# Altium footprint library OpenBMS.PcbLib: 21 footprints (part 2 of 2)
Each footprint in its own frame and in the unit in brackets; x right, y up, seen from the top. Pads: shape width x height; smd on the part's side, far side on the other; paste and mask are expansions set on the pad; w line width, h text height; cw(c..) or ccw(c..) is an arc to the next point about the centre after c.
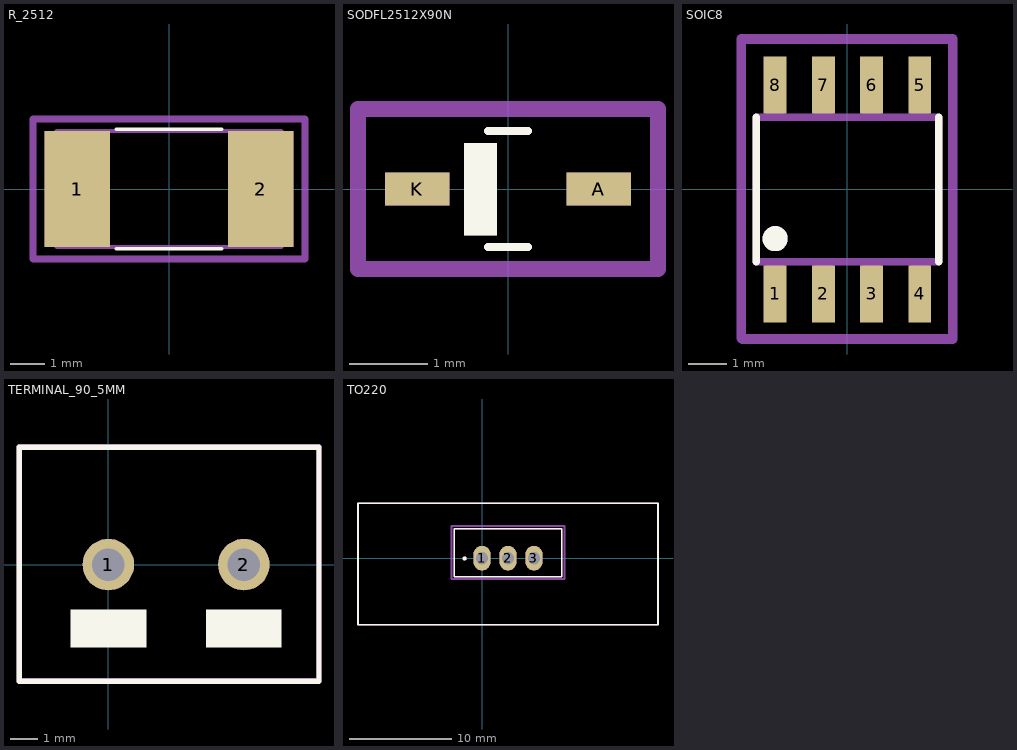
[diagram p1: the footprints below, top view; thin cyan lines are the x and y axes]

## R_2512 [mm]
pads (4):
  rect 1.9x3.37 smd: 1(-2.66,0) 2(2.66,0)
  rect 1.9x3.37 on Mech15: 1(-2.66,0) 2(2.66,0)
Top Overlay:
  lines w0.1: -1.524,-1.727 1.524,-1.727 ; -1.524,1.727 1.524,1.727
Mechanical 4:
  lines w0.127: -3.25,-1.68 3.25,-1.68 ; -3.25,-1.68 -3.25,1.68 ; -3.25,-1.68 3.25,-1.68 ; -3.25,-1.68 -3.25,1.68 ; -3.25,1.68 3.25,1.68 ; -3.25,1.68 3.25,1.68 ; 3.25,-1.68 3.25,1.68 ; 3.25,-1.68 3.25,1.68
Mechanical 15:
  lines w0.2: -3.937,-2.032 3.937,-2.032 3.937,2.032 -3.937,2.032 -3.937,-2.032
3D body "CRGP2512F39R.STEP": height 0.66, standoff 0.01, extent -3.2,-1.6 3.15,1.6

## SODFL2512X90N [mm]
pads (4):
  rect 0.82x0.42 smd: A(1.15,0) K(-1.15,0)
  rect 0.82x0.42 on Mech15: A(1.15,0) K(-1.15,0)
Top Overlay:
  region: -0.141,-0.584 -0.559,-0.584 -0.559,0.584 -0.141,0.584
  lines w0.1: -0.254,-0.737 0.254,-0.737 ; -0.254,0.737 0.254,0.737
Mechanical 15:
  region: -0.141,-0.584 -0.559,-0.584 -0.559,0.584 -0.141,0.584
  lines w0.1: -0.254,-0.737 0.254,-0.737 ; -0.254,0.737 0.254,0.737
  lines w0.2: -1.905,-1.016 -1.905,1.016 1.905,1.016 1.905,-1.016 -1.905,-1.016
3D body "User Library-SOD-323F.STEP": height 0.78, standoff -0.1, extent -1.368,-0.675 1.332,0.675

## SOIC8 [mm]
pads (8):
  rect 0.6x1.5 smd: 1(-1.905,-2.75) 2(-0.635,-2.75) 3(0.635,-2.75) 4(1.905,-2.75) 5(1.905,2.75) 6(0.635,2.75) 7(-0.635,2.75) 8(-1.905,2.75)
Top Overlay:
  circle w0.508: c-1.905,-1.295 r0.076
  lines w0.203: -2.4,-1.9 -2.4,-1.4 -2.4,1.9 ; 2.4,-1.9 2.4,-1.4 2.4,1.9
Mechanical 15:
  circle w0.508: c-1.905,-1.295 r0.076
  region: -0.39,-3.1 -0.88,-3.1 -0.88,-2 -0.39,-2
  region: -0.39,2 -0.88,2 -0.88,3.1 -0.39,3.1
  region: 0.88,-3.1 0.39,-3.1 0.39,-2 0.88,-2
  region: 0.88,2 0.39,2 0.39,3.1 0.88,3.1
  region: -1.66,-3.1 -2.15,-3.1 -2.15,-2 -1.66,-2
  region: -1.66,2 -2.15,2 -2.15,3.1 -1.66,3.1
  region: 2.15,-3.1 1.66,-3.1 1.66,-2 2.15,-2
  region: 2.15,2 1.66,2 1.66,3.1 2.15,3.1
  lines w0.203: -2.4,-1.9 2.4,-1.9 2.4,-1.4 2.4,1.9 -2.4,1.9 -2.4,-1.4 -2.4,-1.9
  lines w0.254: -2.794,-3.912 -2.794,3.962 2.769,3.962 2.769,-3.937 -2.769,-3.937 -2.794,-3.912
3D body "THVD1429DT--3DModel-STEP-56544.STEP": height 1.75, standoff 0, extent -2.451,-2.997 2.451,2.997

## TERMINAL_90_5MM [mm]
pads (4):
  round 1.9 hole 1.2: 1(0,0) 2(5,0)
  round 1.9 on Mech15: 1(0,0) 2(5,0)
Top Overlay:
  rectangle: 3.603,-3.054 6.397,-1.664
  rectangle: -1.397,-3.054 1.397,-1.664
  lines w0.2: -3.3,-4.3 -3.3,4.336 7.775,4.336 7.775,-4.3 -3.3,-4.3
Mechanical 15:
  lines w0.2: -3.302,-4.293 -3.302,4.343 7.772,4.343 7.772,-4.293 -3.302,-4.293
3D body "37818.stp": height 10.01, standoff -3.49, extent -3.05,-4.064 7.52,4.086

## TO220 [mm]
pads (6):
  oval 1.7x2.4 hole 1.2: 1(0,0) 2(2.54,0) 3(5.08,0)
  oval 1.7x2.4 on Mech15: 1(0,0) 2(2.54,0) 3(5.08,0)
Top Overlay:
  circle w0.2: c-1.702,-0.025 r0.1
  lines w0.152: -12.141,-6.502 17.221,-6.502 17.221,5.359 -12.141,5.359 -12.141,-6.502 ; -2.73,-1.8 7.81,-1.8 7.81,2.9 -2.73,2.9 -2.73,-1.8
Mechanical 13:
  lines w0.127: -2.73,-1.8 7.81,-1.8 7.81,2.9 -2.73,2.9 -2.73,-1.8
Mechanical 15:
  circle w0.2: c-1.702,-0.025 r0.1
  lines w0.152: -12.141,-6.502 -12.141,5.359 17.221,5.359 17.221,-6.502 -12.141,-6.502
  lines w0.2: -2.98,-2.052 -2.98,3.148 8.06,3.148 8.06,-2.052 -2.98,-2.052
3D body "LM7805CT--3DModel-STEP-56544.STEP": height 19.4, standoff -10.62, extent -2.444,-1.778 7.525,2.667
3D body "sk_09___l_20.stp": height 20, standoff 0, extent -11.963,-6.318 17.037,5.182